# Altium footprint library IC.PcbLib: 162 footprints (part 11 of 11)
Each footprint in its own frame and in the unit in brackets; x right, y up, seen from the top. Pads: shape width x height; smd on the part's side, far side on the other; paste and mask are expansions set on the pad; w line width, h text height; cw(c..) or ccw(c..) is an arc to the next point about the centre after c.
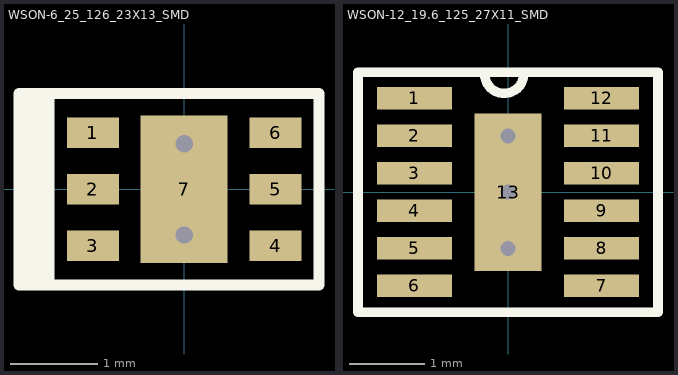
[diagram p10: the footprints below, top view; thin cyan lines are the x and y axes]

## WSON-6_25_126_23X13_SMD [mm] "diode"
height 0.8
pads (7):
  rect 0.6x0.35 smd mask+0.076: 1(-1.05,0.65) 2(-1.05,0) 3(-1.05,-0.65) 4(1.05,-0.65) 5(1.05,0) 6(1.05,0.65)
  rect 1x1.7 smd mask+0.076: 7(0,0)
via 0,0.525 diameter 0.4 hole 0.2
via 0,-0.525 diameter 0.4 hole 0.2
Top Overlay:
  rectangle: -1.85,-1.118 -1.494,1.125
  lines w0.127: -1.1,1.1 1.55,1.1 1.55,-1.1 -1.9,-1.1 -1.9,1.1 -0.9,1.1
3D body "TVS3300DRVR.stp": height 0.8, standoff 0, extent -1.05,-1 1.05,1

## WSON-12_19.6_125_27X11_SMD [mm] "CASE: WSON"
height 0.8
pads (13):
  rect 1x0.3 smd mask+0.076: 1(-1.25,1.25) 2(-1.25,0.75) 3(-1.25,0.25) 4(-1.25,-0.25) 5(-1.25,-0.75) 6(-1.25,-1.25) 7(1.25,-1.25) 8(1.25,-0.75) 9(1.25,-0.25) 10(1.25,0.25) 11(1.25,0.75) 12(1.25,1.25)
  rect 0.889x2.1 smd mask+0.076: 13(0,0)
via 0,0.75 diameter 0.4 hole 0.2
via 0,-0.75 diameter 0.4 hole 0.2
via 0,0 diameter 0.4 hole 0.2
Top Overlay:
  lines w0.127: -0.307,1.535 ccw(c-0.051,1.575) 0.204,1.528 ; -2,-1.6 -2,1.6 2,1.6 2,-1.6 -2,-1.6
3D body "DRV8835DSSR.stp": height 0.8, standoff 0, extent -1.05,-1.5 1.05,1.5